# Altium footprint library Rez-Axial Pot.PcbLib: 113 footprints (part 4 of 8)
Each footprint in its own frame and in the unit in brackets; x right, y up, seen from the top. Pads: shape width x height; smd on the part's side, far side on the other; paste and mask are expansions set on the pad; w line width, h text height; cw(c..) or ccw(c..) is an arc to the next point about the centre after c.
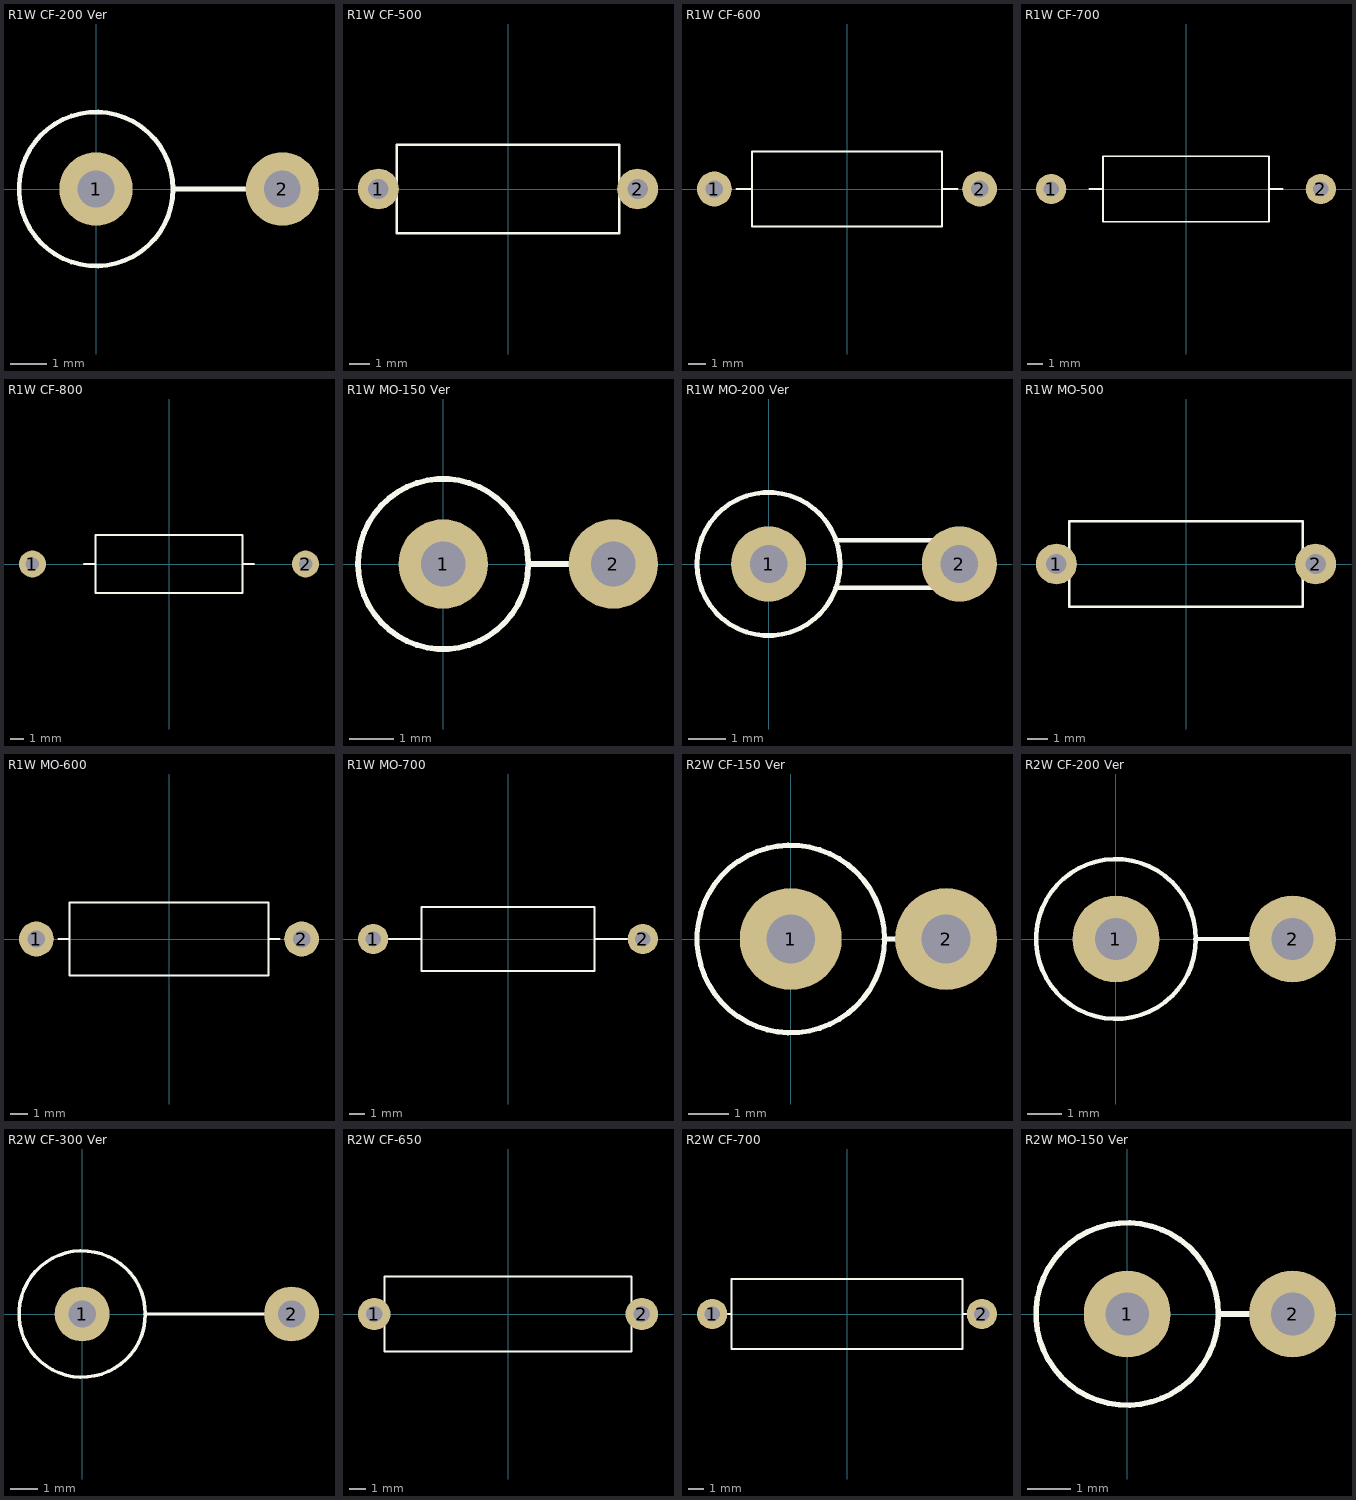
[diagram p3: the footprints below, top view; thin cyan lines are the x and y axes]

## R1W CF-200 Ver [mm]
pads (2):
  round 2 hole 1: 1(0,0) 2(5.08,0)
TopOverlay:
  circle w0.127: c0,0 r2.1
  lines w0.127: 2.159,0 4.445,0
3D body "Res-(1W)CF-200 Ver.STEP": height 15.35, standoff -2.03, extent -2.1,-2.1 5.38,2.1

## R1W CF-500 [mm]
pads (2):
  round 2 hole 1: 1(-6.35,0) 2(6.35,0)
TopOverlay:
  lines w0.127: -6.35,0 -5.461,0 ; 5.461,0 6.35,0 ; -5.461,-2.159 5.461,-2.159 5.461,2.159 -5.461,2.159 -5.461,-2.159
3D body "Res-(1W)CF-500.STEP": height 4.2, standoff -2.54, extent -6.65,-2.1 6.65,2.1

## R1W CF-600 [mm]
pads (2):
  round 2 hole 1: 1(-7.62,0) 2(7.62,0)
TopOverlay:
  lines w0.127: -6.35,0 -5.461,0 ; 5.461,0 6.35,0 ; -5.461,-2.159 5.461,-2.159 5.461,2.159 -5.461,2.159 -5.461,-2.159
3D body "Res-(1W)CF-600.STEP": height 4.2, standoff -2.54, extent -7.92,-2.1 7.92,2.1

## R1W CF-700 [mm]
pads (2):
  round 2 hole 1: 1(-8.89,0) 2(8.89,0)
TopOverlay:
  lines w0.127: -6.35,0 -5.461,0 ; 5.461,0 6.35,0 ; -5.461,-2.159 5.461,-2.159 5.461,2.159 -5.461,2.159 -5.461,-2.159
3D body "Res-(1W)CF-700.STEP": height 4.2, standoff -2.54, extent -9.19,-2.1 9.19,2.1

## R1W CF-800 [mm]
pads (2):
  round 2 hole 1: 1(-10.16,0) 2(10.16,0)
TopOverlay:
  lines w0.127: -6.35,0 -5.461,0 ; 5.461,0 6.35,0 ; -5.461,-2.159 5.461,-2.159 5.461,2.159 -5.461,2.159 -5.461,-2.159
3D body "Res-(1W)CF-800.STEP": height 4.2, standoff -2.54, extent -10.46,-2.1 10.46,2.1

## R1W MO-150 Ver [mm]
pads (2):
  round 2 hole 1: 1(0,0) 2(3.81,0)
TopOverlay:
  circle w0.127: c0,0 r1.905
  lines w0.127: 1.905,0 3.175,0
3D body "Res-(1W)MO-150 Ver.STEP": height 14.7, standoff -2.04, extent -2.3,-2.3 4.11,2.3

## R1W MO-200 Ver [mm]
pads (2):
  round 2 hole 1: 1(0,0) 2(5.08,0)
TopOverlay:
  circle w0.127: c0,0 r1.905
  lines w0.127: 1.778,-0.635 5.08,-0.635 5.08,0.635 1.778,0.635
3D body "Res-(1W)MO-200 Ver.STEP": height 15.34, standoff -2.04, extent -2.3,-2.3 5.38,2.3

## R1W MO-500 [mm]
pads (2):
  round 2 hole 1: 1(-6.35,0) 2(6.35,0)
TopOverlay:
  lines w0.127: -6.35,0 -5.715,0 ; 5.715,0 6.35,0 ; -5.715,-2.1 5.715,-2.1 5.715,2.1 -5.715,2.1 -5.715,-2.1
3D body "Res-(1W)MO-500.STEP": height 4.2, standoff -2.54, extent -6.65,-2.1 6.65,2.1

## R1W MO-600 [mm]
pads (2):
  round 2 hole 1: 1(-7.62,0) 2(7.62,0)
TopOverlay:
  lines w0.127: -6.35,0 -5.715,0 ; 5.715,0 6.35,0 ; -5.715,-2.1 5.715,-2.1 5.715,2.1 -5.715,2.1 -5.715,-2.1
3D body "Res-(1W)MO-600.STEP": height 4.2, standoff -2.54, extent -7.92,-2.1 7.92,2.1

## R1W MO-700 [mm]
pads (2):
  round 2 hole 1: 1(-8.89,0) 2(8.89,0)
TopOverlay:
  lines w0.127: -8.89,0 -5.715,0 ; 5.715,0 8.89,0 ; -5.715,-2.1 5.715,-2.1 5.715,2.1 -5.715,2.1 -5.715,-2.1
3D body "Res-(1W)MO-700.STEP": height 4.2, standoff -2.54, extent -9.19,-2.1 9.19,2.1

## R2W CF-150 Ver [mm]
pads (2):
  round 2.5 hole 1.2: 1(0,0) 2(3.81,0)
TopOverlay:
  circle w0.127: c0,0 r2.3
  lines w0.127: 2.286,0 3.175,0
3D body "Res-(2W)CF-150 Ver.STEP": height 18.31, standoff -2.03, extent -2.302,-2.302 4.21,2.302

## R2W CF-200 Ver [mm]
pads (2):
  round 2.5 hole 1.2: 1(0,0) 2(5.08,0)
TopOverlay:
  circle w0.127: c0,0 r2.3
  lines w0.127: 2.286,0 4.445,0
3D body "Res-(2W)CF-200 Ver.STEP": height 18.95, standoff -2.03, extent -2.302,-2.302 5.48,2.302

## R2W CF-300 Ver [mm]
pads (2):
  round 2 hole 1: 1(0,0) 2(7.62,0)
TopOverlay:
  circle w0.127: c0,0 r2.3
  lines w0.127: 2.286,0 6.985,0
3D body "Res-(2W)CF-300 Ver.STEP": height 20.22, standoff -2.03, extent -2.302,-2.302 8.02,2.302

## R2W CF-650 [mm]
pads (2):
  round 2 hole 1: 1(-8.255,0) 2(8.255,0)
TopOverlay:
  lines w0.127: -8.255,0 -7.62,0 ; 7.62,0 8.255,0 ; -7.62,-2.302 -7.62,2.302 7.62,2.302 7.62,-2.302 -7.62,-2.302
3D body "Res-(2W)CF-650.STEP": height 4.6, standoff -2.54, extent -8.605,-2.302 8.605,2.302

## R2W CF-700 [mm]
pads (2):
  round 2 hole 1: 1(-8.89,0) 2(8.89,0)
TopOverlay:
  lines w0.127: -8.255,0 -7.62,0 ; 7.62,0 8.255,0 ; -7.62,-2.302 7.62,-2.302 7.62,2.302 -7.62,2.302 -7.62,-2.302
3D body "Res-(2W)CF-700.STEP": height 4.6, standoff -2.54, extent -9.24,-2.302 9.24,2.302

## R2W MO-150 Ver [mm]
pads (2):
  round 2 hole 1: 1(0,0) 2(3.81,0)
TopOverlay:
  circle w0.127: c0,0 r2.1
  lines w0.127: 2.1,0 3.175,0
3D body "Res-(2W)MO-150 Ver.STEP": height 15.31, standoff -2.03, extent -2.302,-2.302 4.21,2.302